# Altium footprint library Flight_controller v1.0.PcbLib: 98 footprints (part 7 of 7)
Each footprint in its own frame and in the unit in brackets; x right, y up, seen from the top. Pads: shape width x height; smd on the part's side, far side on the other; paste and mask are expansions set on the pad; w line width, h text height; cw(c..) or ccw(c..) is an arc to the next point about the centre after c.
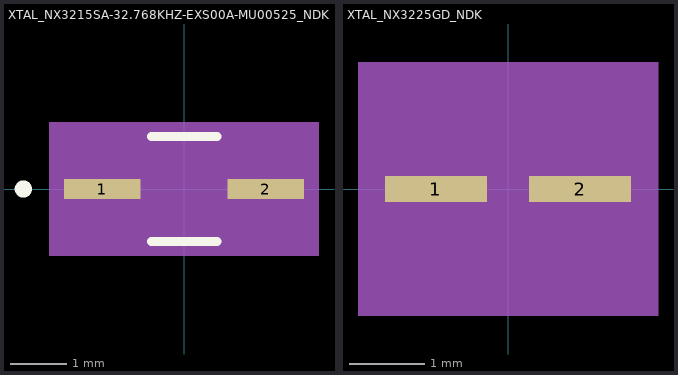
[diagram p6: the footprints below, top view; thin cyan lines are the x and y axes]

## XTAL_NX3215SA-32.768KHZ-EXS00A-MU00525_NDK [mm]
pads (2):
  rect 1.35x0.35 smd paste+0.05 mask+0.05: 1(-1.445,0) 2(1.445,0)
Top Overlay:
  circle w0.152: c-2.839,0 r0.076
  lines w0.152: -0.581,-0.927 0.581,-0.927 ; -0.581,0.927 0.581,0.927
Mechanical 5:
  region: 2.382,-1.181 -2.382,-1.181 -2.382,1.181 2.382,1.181
Mechanical 13:
  circle w0: c-1.318,0 r0.076
  lines w0.025: -1.651,-0.8 -1.651,0.8 ; -1.651,-0.8 1.651,-0.8 ; -1.651,-0.8 -0.889,-0.8 -0.889,0.8 -1.651,0.8 ; -1.651,-0.8 -1.651,0.8 ; -1.651,0.8 1.651,0.8 ; 1.651,-0.8 1.651,0.8 ; 1.651,-0.8 1.651,0.8 ; 1.651,-0.8 0.889,-0.8 0.889,0.8 1.651,0.8
Mechanical 15:
  region: 2.255,-1.054 -2.255,-1.054 -2.255,1.054 2.255,1.054
  lines w0.152: -2.255,-1.054 2.255,-1.054 2.255,1.054 -2.255,1.054 -2.255,-1.054
3D body: height 0.25, standoff 0, extent 0,0 0.254,0.254
3D body "XTAL_NX3215SA-32_768KHZ-EXS00A-MU00525_NDK.step": height 0.89, standoff 0, extent -1.651,-0.8 1.651,0.8

## XTAL_NX3225GD_NDK [mm]
pads (2):
  rect 1.35x0.35 smd paste+0.05 mask+0.05: 1(-0.953,0) 2(0.953,0)
Mechanical 5:
  region: 1.981,-1.676 -1.981,-1.676 -1.981,1.676 1.981,1.676
Mechanical 13:
  lines w0.025: -1.651,-1.295 1.651,-1.295 1.651,1.295 -1.651,1.295 -1.651,-1.295
Mechanical 15:
  region: -1.905,-1.448 -1.905,1.448 -1.905,1.549 1.905,1.549 1.905,1.448 1.905,-1.448 1.905,-1.549 -1.905,-1.549
  lines w0.152: -1.905,-1.549 -1.905,-1.448 -1.905,1.448 -1.905,1.549 1.905,1.549 1.905,1.448 1.905,-1.448 1.905,-1.549 -1.905,-1.549
3D body "XTAL_NX3225GD_NDK.step": height 0.99, standoff 0, extent -1.651,-1.295 1.651,1.295